# Altium footprint library CONNECTOR.PcbLib: 169 footprints (part 3 of 11)
Each footprint in its own frame and in the unit in brackets; x right, y up, seen from the top. Pads: shape width x height; smd on the part's side, far side on the other; paste and mask are expansions set on the pad; w line width, h text height; cw(c..) or ccw(c..) is an arc to the next point about the centre after c.
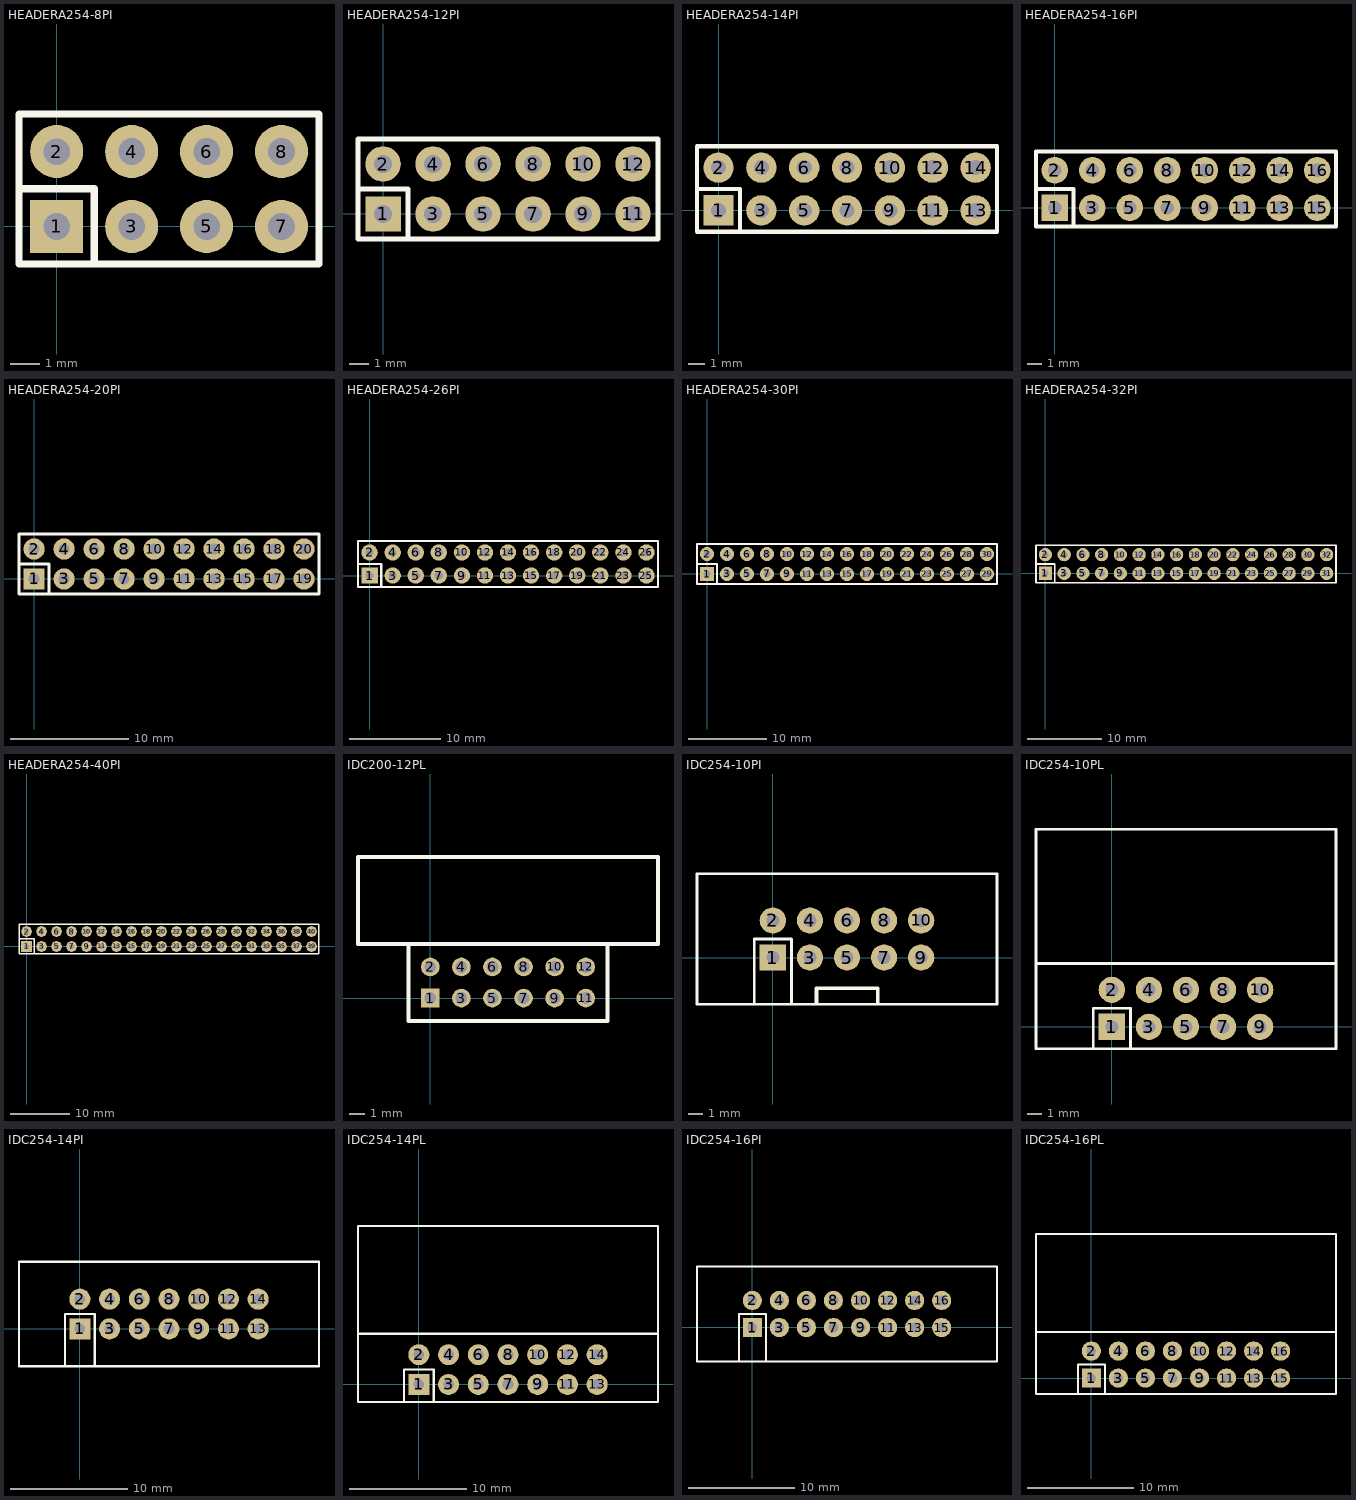
[diagram p2: the footprints below, top view; thin cyan lines are the x and y axes]

## HEADERA254-8PI [mm]
pads (8):
  rect 1.8x1.8 hole 0.9: 1(-0.001,0)
  round 1.8 hole 0.9: 2(-0.001,2.539) 3(2.54,0) 4(2.54,2.54) 5(5.08,0) 6(5.08,2.54) 7(7.62,0) 8(7.62,2.54)
Top Overlay:
  lines w0.25: -1.268,1.275 1.269,1.275 1.269,-1.27 ; -1.276,-1.27 -1.276,3.81 8.89,3.81 8.89,-1.27 -1.276,-1.27
3D body "SIP2.STEP": height 8.64, standoff -3, extent -1.271,-1.261 1.269,3.819
3D body "SIP2.STEP": height 8.64, standoff -3, extent 1.27,-1.26 3.81,3.82
3D body "SIP2.STEP": height 8.64, standoff -3, extent 3.81,-1.26 6.35,3.82
3D body "SIP2.STEP": height 8.64, standoff -3, extent 6.35,-1.26 8.89,3.82

## HEADERA254-12PI [mm]
pads (12):
  rect 1.8x1.8 hole 0.9: 1(-0.001,0)
  round 1.8 hole 0.9: 2(-0.001,2.539) 3(2.54,0) 4(2.54,2.54) 5(5.08,0) 6(5.08,2.54) 7(7.62,0) 8(7.62,2.54) 9(10.16,0) 10(10.16,2.54) 11(12.7,0) 12(12.7,2.54)
Top Overlay:
  lines w0.25: -1.268,1.275 1.269,1.275 1.269,-1.27 ; -1.276,-1.27 -1.276,3.81 13.97,3.81 13.97,-1.27 -1.276,-1.27
3D body "SIP2.STEP": height 8.64, standoff -3, extent -1.271,-1.261 1.269,3.819
3D body "SIP2.STEP": height 8.64, standoff -3, extent 1.269,-1.261 3.809,3.819
3D body "SIP2.STEP": height 8.64, standoff -3, extent 3.81,-1.26 6.35,3.82
3D body "SIP2.STEP": height 8.64, standoff -3, extent 6.35,-1.26 8.89,3.82
3D body "SIP2.STEP": height 8.64, standoff -3, extent 8.89,-1.26 11.43,3.82
3D body "SIP2.STEP": height 8.64, standoff -3, extent 11.43,-1.26 13.97,3.82

## HEADERA254-14PI [mm]
pads (14):
  rect 1.8x1.8 hole 0.9: 1(-0.001,0)
  round 1.8 hole 0.9: 2(-0.001,2.539) 3(2.54,0) 4(2.54,2.54) 5(5.08,0) 6(5.08,2.54) 7(7.62,0) 8(7.62,2.54) 9(10.16,0) 10(10.16,2.54) 11(12.7,0) 12(12.7,2.54) 13(15.24,0) 14(15.24,2.54)
Top Overlay:
  lines w0.25: -1.268,1.275 1.269,1.275 1.269,-1.27 ; -1.276,-1.27 -1.276,3.81 16.51,3.81 16.51,-1.27 -1.276,-1.27
3D body "SIP2.STEP": height 8.64, standoff -3, extent -1.271,-1.261 1.269,3.819
3D body "SIP2.STEP": height 8.64, standoff -3, extent 1.269,-1.261 3.809,3.819
3D body "SIP2.STEP": height 8.64, standoff -3, extent 3.81,-1.26 6.35,3.82
3D body "SIP2.STEP": height 8.64, standoff -3, extent 6.35,-1.26 8.89,3.82
3D body "SIP2.STEP": height 8.64, standoff -3, extent 8.89,-1.26 11.43,3.82
3D body "SIP2.STEP": height 8.64, standoff -3, extent 11.43,-1.26 13.97,3.82
3D body "SIP2.STEP": height 8.64, standoff -3, extent 13.97,-1.26 16.51,3.82

## HEADERA254-16PI [mm]
pads (16):
  rect 1.8x1.8 hole 0.9: 1(-0.001,0)
  round 1.8 hole 0.9: 2(-0.001,2.539) 3(2.54,0) 4(2.54,2.54) 5(5.08,0) 6(5.08,2.54) 7(7.62,0) 8(7.62,2.54) 9(10.16,0) 10(10.16,2.54) 11(12.7,0) 12(12.7,2.54) 13(15.24,0) 14(15.24,2.54) 15(17.78,0) 16(17.78,2.54)
Top Overlay:
  lines w0.25: -1.268,1.275 1.269,1.275 1.269,-1.27 ; -1.276,-1.27 19.05,-1.27 19.05,3.81 -1.276,3.81 -1.276,-1.27
3D body "SIP2.STEP": height 8.64, standoff -3, extent 16.51,-1.26 19.05,3.82
3D body "SIP2.STEP": height 8.64, standoff -3, extent 13.97,-1.26 16.51,3.82
3D body "SIP2.STEP": height 8.64, standoff -3, extent 11.43,-1.26 13.97,3.82
3D body "SIP2.STEP": height 8.64, standoff -3, extent 8.89,-1.26 11.43,3.82
3D body "SIP2.STEP": height 8.64, standoff -3, extent 6.35,-1.26 8.89,3.82
3D body "SIP2.STEP": height 8.64, standoff -3, extent 3.81,-1.26 6.35,3.82
3D body "SIP2.STEP": height 8.64, standoff -3, extent 1.269,-1.261 3.809,3.819
3D body "SIP2.STEP": height 8.64, standoff -3, extent -1.271,-1.261 1.269,3.819

## HEADERA254-20PI [mm]
pads (20):
  rect 1.8x1.8 hole 0.9: 1(0,0)
  round 1.8 hole 0.9: 2(0,2.54) 3(2.54,0) 4(2.54,2.54) 5(5.08,0) 6(5.08,2.54) 7(7.62,0) 8(7.62,2.54) 9(10.16,0) 10(10.16,2.54) 11(12.7,0) 12(12.7,2.54) 13(15.24,0) 14(15.24,2.54) 15(17.78,0) 16(17.78,2.54) 17(20.32,0) 18(20.32,2.54) 19(22.86,0) 20(22.86,2.54)
Top Overlay:
  lines w0.25: -1.268,1.275 1.269,1.275 1.269,-1.27 ; -1.276,-1.27 -1.276,3.81 24.13,3.81 24.13,-1.27 -1.276,-1.27
3D body "SIP2.STEP": height 8.64, standoff -3, extent -1.27,-1.26 1.27,3.82
3D body "SIP2.STEP": height 8.64, standoff -3, extent 1.27,-1.26 3.81,3.82
3D body "SIP2.STEP": height 8.64, standoff -3, extent 3.81,-1.26 6.35,3.82
3D body "SIP2.STEP": height 8.64, standoff -3, extent 6.35,-1.26 8.89,3.82
3D body "SIP2.STEP": height 8.64, standoff -3, extent 8.89,-1.26 11.43,3.82
3D body "SIP2.STEP": height 8.64, standoff -3, extent 11.43,-1.26 13.97,3.82
3D body "SIP2.STEP": height 8.64, standoff -3, extent 13.97,-1.26 16.51,3.82
3D body "SIP2.STEP": height 8.64, standoff -3, extent 16.51,-1.26 19.05,3.82
3D body "SIP2.STEP": height 8.64, standoff -3, extent 19.05,-1.26 21.59,3.82
3D body "SIP2.STEP": height 8.64, standoff -3, extent 21.59,-1.26 24.13,3.82

## HEADERA254-26PI [mm]
pads (26):
  rect 1.8x1.8 hole 0.9: 1(-0.001,0)
  round 1.8 hole 0.9: 2(-0.001,2.539) 3(2.54,0) 4(2.54,2.54) 5(5.08,0) 6(5.08,2.54) 7(7.62,0) 8(7.62,2.54) 9(10.16,0) 10(10.16,2.54) 11(12.7,0) 12(12.7,2.54) 13(15.24,0) 14(15.24,2.54) 15(17.78,0) 16(17.78,2.54) 17(20.32,0) 18(20.32,2.54) 19(22.86,0) 20(22.86,2.54) 21(25.4,0) 22(25.4,2.54) 23(27.94,0) 24(27.94,2.54) 25(30.48,0) 26(30.48,2.54)
Top Overlay:
  lines w0.25: -1.268,1.275 1.269,1.275 1.269,-1.27 ; -1.276,-1.27 31.75,-1.27 31.75,3.81 -1.276,3.81 -1.276,-1.27
3D body "SIP2.STEP": height 8.64, standoff -3, extent -1.271,-1.261 1.269,3.819
3D body "SIP2.STEP": height 8.64, standoff -3, extent 1.269,-1.261 3.809,3.819
3D body "SIP2.STEP": height 8.64, standoff -3, extent 3.81,-1.26 6.35,3.82
3D body "SIP2.STEP": height 8.64, standoff -3, extent 6.35,-1.26 8.89,3.82
3D body "SIP2.STEP": height 8.64, standoff -3, extent 8.89,-1.26 11.43,3.82
3D body "SIP2.STEP": height 8.64, standoff -3, extent 11.43,-1.26 13.97,3.82
3D body "SIP2.STEP": height 8.64, standoff -3, extent 13.97,-1.26 16.51,3.82
3D body "SIP2.STEP": height 8.64, standoff -3, extent 16.51,-1.26 19.05,3.82
3D body "SIP2.STEP": height 8.64, standoff -3, extent 19.05,-1.26 21.59,3.82
3D body "SIP2.STEP": height 8.64, standoff -3, extent 21.59,-1.26 24.13,3.82
3D body "SIP2.STEP": height 8.64, standoff -3, extent 24.13,-1.26 26.67,3.82
3D body "SIP2.STEP": height 8.64, standoff -3, extent 26.67,-1.26 29.21,3.82
3D body "SIP2.STEP": height 8.64, standoff -3, extent 29.21,-1.26 31.75,3.82

## HEADERA254-30PI [mm]
pads (30):
  rect 1.8x1.8 hole 0.9: 1(-0.001,0)
  round 1.8 hole 0.9: 2(-0.001,2.539) 3(2.54,0) 4(2.54,2.54) 5(5.08,0) 6(5.08,2.54) 7(7.62,0) 8(7.62,2.54) 9(10.16,0) 10(10.16,2.54) 11(12.7,0) 12(12.7,2.54) 13(15.24,0) 14(15.24,2.54) 15(17.78,0) 16(17.78,2.54) 17(20.32,0) 18(20.32,2.54) 19(22.86,0) 20(22.86,2.54) 21(25.4,0) 22(25.4,2.54) 23(27.94,0) 24(27.94,2.54) 25(30.48,0) 26(30.48,2.54) 27(33.02,0) 28(33.02,2.54) 29(35.56,0) 30(35.56,2.54)
Top Overlay:
  lines w0.25: -1.268,1.275 1.269,1.275 1.269,-1.27 ; -1.276,-1.27 36.83,-1.27 36.83,3.81 -1.276,3.81 -1.276,-1.27
3D body "SIP2.STEP": height 8.64, standoff -3, extent -1.271,-1.261 1.269,3.819
3D body "SIP2.STEP": height 8.64, standoff -3, extent 1.269,-1.261 3.809,3.819
3D body "SIP2.STEP": height 8.64, standoff -3, extent 3.81,-1.26 6.35,3.82
3D body "SIP2.STEP": height 8.64, standoff -3, extent 6.35,-1.26 8.89,3.82
3D body "SIP2.STEP": height 8.64, standoff -3, extent 8.89,-1.26 11.43,3.82
3D body "SIP2.STEP": height 8.64, standoff -3, extent 11.43,-1.26 13.97,3.82
3D body "SIP2.STEP": height 8.64, standoff -3, extent 13.97,-1.26 16.51,3.82
3D body "SIP2.STEP": height 8.64, standoff -3, extent 16.51,-1.26 19.05,3.82
3D body "SIP2.STEP": height 8.64, standoff -3, extent 19.05,-1.26 21.59,3.82
3D body "SIP2.STEP": height 8.64, standoff -3, extent 21.59,-1.26 24.13,3.82
3D body "SIP2.STEP": height 8.64, standoff -3, extent 24.13,-1.26 26.67,3.82
3D body "SIP2.STEP": height 8.64, standoff -3, extent 26.67,-1.26 29.21,3.82
3D body "SIP2.STEP": height 8.64, standoff -3, extent 29.21,-1.26 31.75,3.82
3D body "SIP2.STEP": height 8.64, standoff -3, extent 31.75,-1.26 34.29,3.82
3D body "SIP2.STEP": height 8.64, standoff -3, extent 34.29,-1.26 36.83,3.82

## HEADERA254-32PI [mm]
pads (32):
  rect 1.8x1.8 hole 0.9: 1(-0.001,0)
  round 1.8 hole 0.9: 2(-0.001,2.539) 3(2.54,0) 4(2.54,2.54) 5(5.08,0) 6(5.08,2.54) 7(7.62,0) 8(7.62,2.54) 9(10.16,0) 10(10.16,2.54) 11(12.7,0) 12(12.7,2.54) 13(15.24,0) 14(15.24,2.54) 15(17.78,0) 16(17.78,2.54) 17(20.32,0) 18(20.32,2.54) 19(22.86,0) 20(22.86,2.54) 21(25.4,0) 22(25.4,2.54) 23(27.94,0) 24(27.94,2.54) 25(30.48,0) 26(30.48,2.54) 27(33.02,0) 28(33.02,2.54) 29(35.56,0) 30(35.56,2.54) 31(38.1,0) 32(38.1,2.54)
Top Overlay:
  lines w0.25: -1.268,1.275 1.269,1.275 1.269,-1.27 ; -1.276,-1.27 -1.276,3.81 39.37,3.81 39.37,-1.27 -1.276,-1.27
3D body "SIP2.STEP": height 8.64, standoff -3, extent -1.271,-1.261 1.269,3.819
3D body "SIP2.STEP": height 8.64, standoff -3, extent 1.269,-1.261 3.809,3.819
3D body "SIP2.STEP": height 8.64, standoff -3, extent 3.81,-1.26 6.35,3.82
3D body "SIP2.STEP": height 8.64, standoff -3, extent 6.35,-1.26 8.89,3.82
3D body "SIP2.STEP": height 8.64, standoff -3, extent 8.89,-1.26 11.43,3.82
3D body "SIP2.STEP": height 8.64, standoff -3, extent 11.43,-1.26 13.97,3.82
3D body "SIP2.STEP": height 8.64, standoff -3, extent 13.97,-1.26 16.51,3.82
3D body "SIP2.STEP": height 8.64, standoff -3, extent 16.51,-1.26 19.05,3.82
3D body "SIP2.STEP": height 8.64, standoff -3, extent 19.05,-1.26 21.59,3.82
3D body "SIP2.STEP": height 8.64, standoff -3, extent 21.59,-1.26 24.13,3.82
3D body "SIP2.STEP": height 8.64, standoff -3, extent 24.13,-1.26 26.67,3.82
3D body "SIP2.STEP": height 8.64, standoff -3, extent 26.67,-1.26 29.21,3.82
3D body "SIP2.STEP": height 8.64, standoff -3, extent 29.21,-1.26 31.75,3.82
3D body "SIP2.STEP": height 8.64, standoff -3, extent 36.83,-1.259 39.37,3.821
3D body "SIP2.STEP": height 8.64, standoff -3, extent 34.29,-1.26 36.83,3.82
3D body "SIP2.STEP": height 8.64, standoff -3, extent 31.75,-1.26 34.29,3.82

## HEADERA254-40PI [mm]
pads (40):
  rect 1.8x1.8 hole 0.9: 1(0,0)
  round 1.8 hole 0.9: 2(0,2.54) 3(2.54,0) 4(2.54,2.54) 5(5.08,0) 6(5.08,2.54) 7(7.62,0) 8(7.62,2.54) 9(10.16,0) 10(10.16,2.54) 11(12.7,0) 12(12.7,2.54) 13(15.24,0) 14(15.24,2.54) 15(17.78,0) 16(17.78,2.54) 17(20.32,0) 18(20.32,2.54) 19(22.86,0) 20(22.86,2.54) 21(25.4,0) 22(25.4,2.54) 23(27.94,0) 24(27.94,2.54) 25(30.48,0) 26(30.48,2.54) 27(33.02,0) 28(33.02,2.54) 29(35.56,0) 30(35.56,2.54) 31(38.1,0) 32(38.1,2.54) 33(40.64,0) 34(40.64,2.54) 35(43.18,0) 36(43.18,2.54) 37(45.72,0) 38(45.72,2.54) 39(48.26,0) 40(48.26,2.54)
Top Overlay:
  lines w0.25: -1.268,1.275 1.269,1.275 1.269,-1.27 ; -1.276,-1.27 49.53,-1.27 49.53,3.81 -1.276,3.81 -1.276,-1.27
3D body "SIP2.STEP": height 8.64, standoff -3, extent 29.21,-1.259 31.75,3.821
3D body "SIP2.STEP": height 8.64, standoff -3, extent 26.67,-1.259 29.21,3.821
3D body "SIP2.STEP": height 8.64, standoff -3, extent 24.13,-1.259 26.67,3.821
3D body "SIP2.STEP": height 8.64, standoff -3, extent 21.59,-1.259 24.13,3.821
3D body "SIP2.STEP": height 8.64, standoff -3, extent 19.05,-1.259 21.59,3.821
3D body "SIP2.STEP": height 8.64, standoff -3, extent 16.51,-1.259 19.05,3.821
3D body "SIP2.STEP": height 8.64, standoff -3, extent 13.97,-1.259 16.51,3.821
3D body "SIP2.STEP": height 8.64, standoff -3, extent 11.43,-1.259 13.97,3.821
3D body "SIP2.STEP": height 8.64, standoff -3, extent 8.89,-1.259 11.43,3.821
3D body "SIP2.STEP": height 8.64, standoff -3, extent 6.35,-1.259 8.89,3.821
3D body "SIP2.STEP": height 8.64, standoff -3, extent 3.81,-1.259 6.35,3.821
3D body "SIP2.STEP": height 8.64, standoff -3, extent 1.27,-1.26 3.81,3.82
3D body "SIP2.STEP": height 8.64, standoff -3, extent -1.27,-1.26 1.27,3.82
3D body "SIP2.STEP": height 8.64, standoff -3, extent 46.99,-1.259 49.53,3.821
3D body "SIP2.STEP": height 8.64, standoff -3, extent 44.45,-1.259 46.99,3.821
3D body "SIP2.STEP": height 8.64, standoff -3, extent 41.91,-1.259 44.45,3.821
3D body "SIP2.STEP": height 8.64, standoff -3, extent 39.37,-1.259 41.91,3.821
3D body "SIP2.STEP": height 8.64, standoff -3, extent 36.83,-1.259 39.37,3.821
3D body "SIP2.STEP": height 8.64, standoff -3, extent 34.29,-1.26 36.83,3.82
3D body "SIP2.STEP": height 8.64, standoff -3, extent 31.75,-1.26 34.29,3.82

## IDC200-12PL [mm]
pads (12):
  rect 1.2x1.2 hole 0.75: 1(0,0)
  round 1.2 hole 0.75: 2(0,2) 3(2,0) 4(2,2) 5(4,0) 6(4,2) 7(6,0) 8(6,2) 9(8,0) 10(8,2) 11(10,0) 12(10,2)
Top Overlay:
  lines w0.25: -1.412,3.475 -1.412,-1.475 11.412,-1.475 11.412,3.475 ; -4.65,3.475 -4.65,9.075 14.65,9.075 14.65,3.475 -4.65,3.475

## IDC254-10PI [mm]
pads (10):
  rect 1.8x1.8 hole 0.9: 1(0,0)
  round 1.8 hole 0.9: 2(0,2.54) 3(2.54,0) 4(2.54,2.54) 5(5.08,0) 6(5.08,2.54) 7(7.62,0) 8(7.62,2.54) 9(10.16,0) 10(10.16,2.54)
Top Overlay:
  lines w0.2: -1.275,-3.2 -1.275,1.275 1.265,1.275 ; 1.27,-3.2 1.27,1.27 ; -5.2,-3.2 15.36,-3.2 15.36,5.74 -5.2,5.74 -5.2,-3.2
  lines w0.254: 2.996,-3.16 2.996,-2.114 7.183,-2.114 7.183,-3.172
3D body "User Library-IDC-10M.STEP": height 9.3, standoff -3.1, extent -5.066,-3.134 15.234,5.966

## IDC254-10PL [mm]
pads (10):
  rect 1.8x1.8 hole 0.9: 1(0,0)
  round 1.8 hole 0.9: 2(0,2.54) 3(2.54,0) 4(2.54,2.54) 5(5.08,0) 6(5.08,2.54) 7(7.62,0) 8(7.62,2.54) 9(10.16,0) 10(10.16,2.54)
Top Overlay:
  lines w0.2: -5.2,4.34 15.36,4.34 ; -1.275,-1.5 -1.275,1.275 1.265,1.275 ; 1.27,-1.5 1.27,1.27 ; -5.2,-1.5 15.36,-1.5 15.36,13.54 -5.2,13.54 -5.2,-1.5
3D body "User Library-IDC Socket Male 10pin Angled THT Goldplated 2_54mm.STEP": height 7.98, standoff -3.37, extent -5.437,-0.346 15.503,13.214

## IDC254-14PI [mm]
pads (14):
  rect 1.8x1.8 hole 0.9: 1(-0.005,-0.001)
  round 1.8 hole 0.9: 2(-0.005,2.539) 3(2.535,-0.001) 4(2.535,2.539) 5(5.075,-0.001) 6(5.075,2.539) 7(7.615,-0.001) 8(7.615,2.539) 9(10.155,-0.001) 10(10.155,2.539) 11(12.695,-0.001) 12(12.695,2.539) 13(15.235,-0.001) 14(15.235,2.539)
Top Overlay:
  lines w0.2: -1.275,-3.201 -1.275,1.269 1.265,1.269 1.265,-3.201 ; -5.205,-3.201 -5.205,5.739 20.435,5.739 20.435,-3.201 -5.205,-3.201
3D body "User Library-IDC-14M.STEP": height 9.3, standoff -3.1, extent -5.049,-3.125 20.331,5.975

## IDC254-14PL [mm]
pads (14):
  rect 1.8x1.8 hole 0.9: 1(0,0)
  round 1.8 hole 0.9: 2(0,2.54) 3(2.54,0) 4(2.54,2.54) 5(5.08,0) 6(5.08,2.54) 7(7.62,0) 8(7.62,2.54) 9(10.16,0) 10(10.16,2.54) 11(12.7,0) 12(12.7,2.54) 13(15.24,0) 14(15.24,2.54)
Top Overlay:
  lines w0.2: -5.2,4.34 20.44,4.34 ; -1.27,-1.5 -1.27,1.27 1.27,1.27 1.27,-1.5 ; -5.2,-1.5 20.44,-1.5 20.44,13.54 -5.2,13.54 -5.2,-1.5
3D body "User Library-IDC Socket Male 14pin Angled THT Goldplated 2_54mm.STEP": height 7.98, standoff -3.37, extent -5.402,-0.317 20.618,13.243

## IDC254-16PI [mm]
pads (16):
  rect 1.8x1.8 hole 0.9: 1(0,-0.004)
  round 1.8 hole 0.9: 2(0,2.536) 3(2.54,-0.004) 4(2.54,2.536) 5(5.08,-0.004) 6(5.08,2.536) 7(7.62,-0.004) 8(7.62,2.536) 9(10.16,-0.004) 10(10.16,2.536) 11(12.7,-0.004) 12(12.7,2.536) 13(15.24,-0.004) 14(15.24,2.536) 15(17.78,-0.004) 16(17.78,2.536)
Top Overlay:
  lines w0.2: -1.27,-3.204 -1.27,1.266 1.27,1.266 1.27,-3.204 ; -5.2,-3.204 -5.2,5.736 22.98,5.736 22.98,-3.204 -5.2,-3.204
3D body "User Library-User Library-IDC-16M.STEP": height 9.3, standoff -3.1, extent -5.13,-3.101 22.87,5.999

## IDC254-16PL [mm]
pads (16):
  rect 1.8x1.8 hole 0.9: 1(0,0)
  round 1.8 hole 0.9: 2(0,2.54) 3(2.54,0) 4(2.54,2.54) 5(5.08,0) 6(5.08,2.54) 7(7.62,0) 8(7.62,2.54) 9(10.16,0) 10(10.16,2.54) 11(12.7,0) 12(12.7,2.54) 13(15.24,0) 14(15.24,2.54) 15(17.78,0) 16(17.78,2.54)
Top Overlay:
  lines w0.2: -5.2,4.34 22.98,4.34 ; -1.27,-1.5 -1.27,1.27 1.27,1.27 1.27,-1.5 ; -5.2,-1.5 -5.2,13.54 22.98,13.54 22.98,-1.5 -5.2,-1.5
3D body "User Library-IDC Socket Male 16pin Angled THT Goldplated 2_54mm.STEP": height 7.98, standoff -3.37, extent -5.389,-0.329 23.171,13.231